# Altium footprint library Watch Max.PcbLib: 66 footprints (part 3 of 5)
Each footprint in its own frame and in the unit in brackets; x right, y up, seen from the top. Pads: shape width x height; smd on the part's side, far side on the other; paste and mask are expansions set on the pad; w line width, h text height; cw(c..) or ccw(c..) is an arc to the next point about the centre after c.
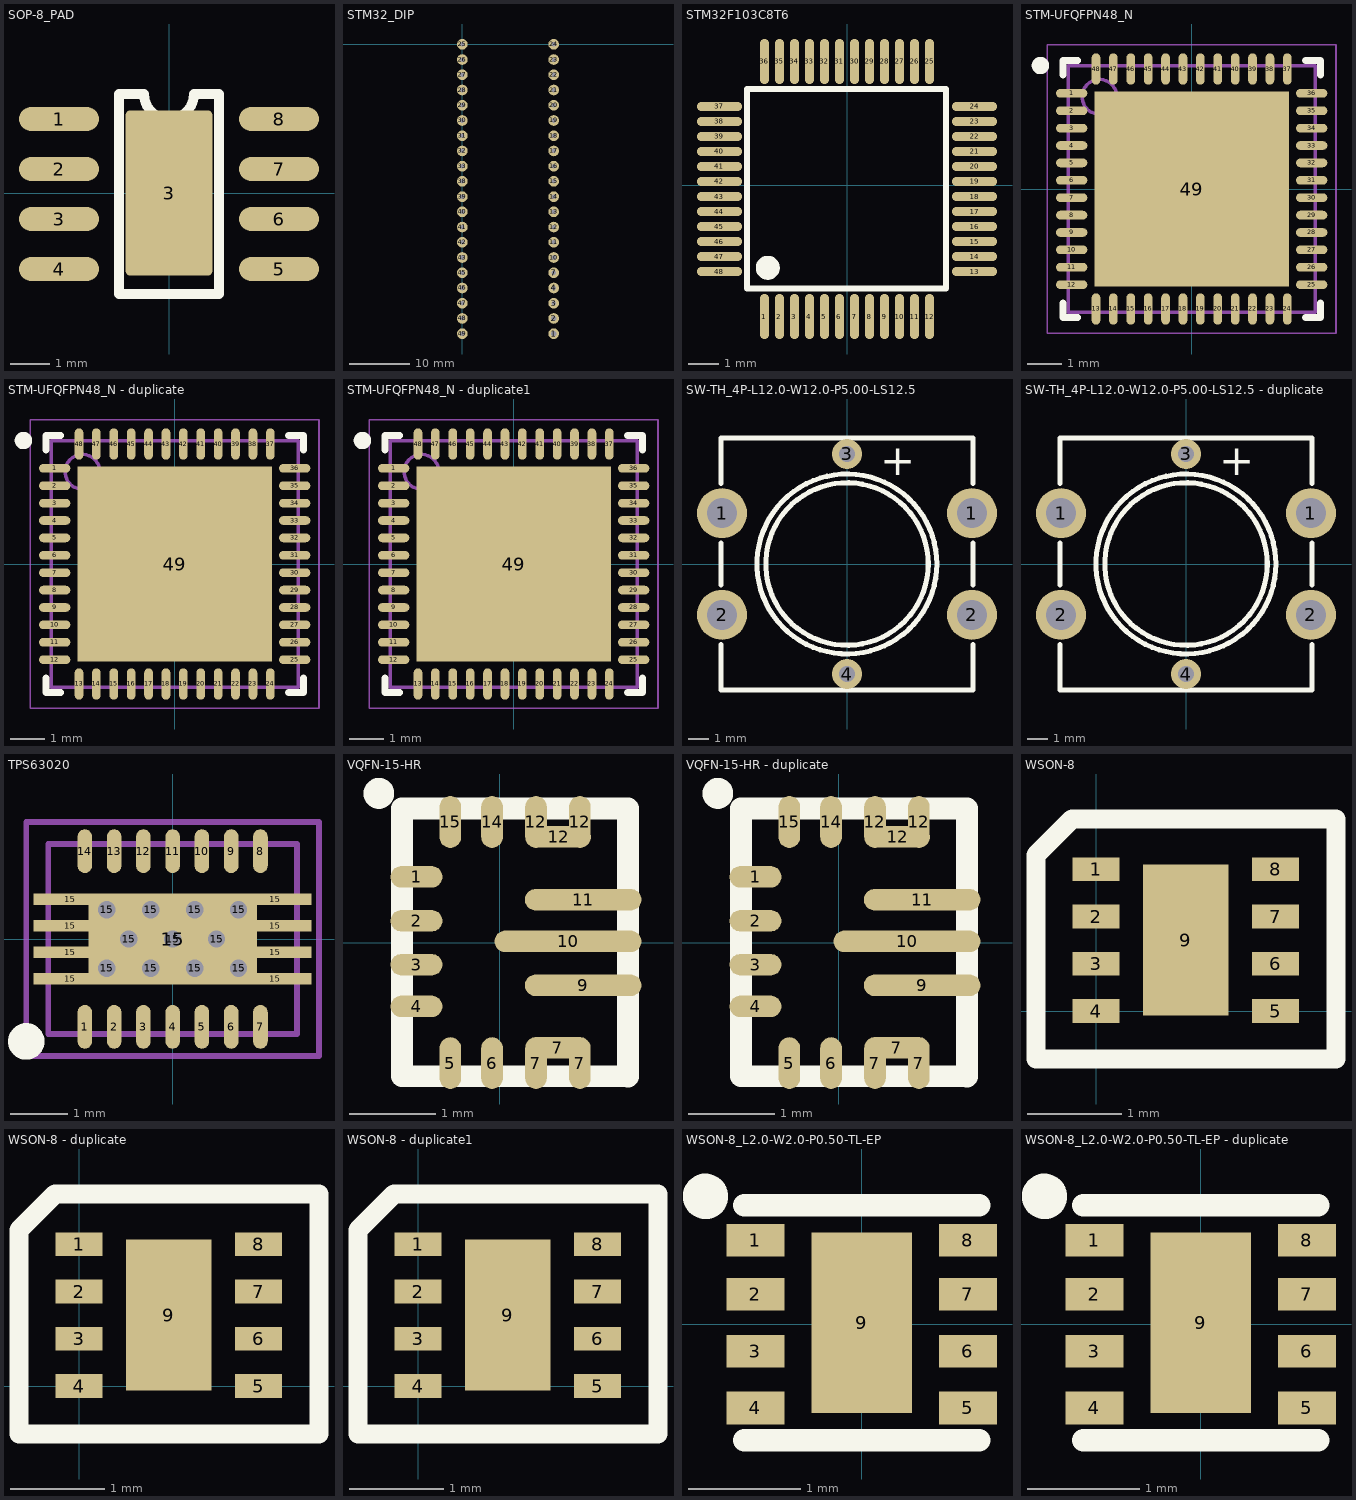
[diagram p2: the footprints below, top view; thin cyan lines are the x and y axes]

## SOP-8_PAD [mil]
pads (9):
  oval 80x24 smd: 1(-110,74) 2(-110,24) 3(-110,-26) 4(-110,-76) 5(110,-76) 6(110,-26) 7(110,24) 8(110,74)
  rrect10% 86.61x165.35 smd: 3(0,0)
Top Overlay:
  lines w10: -50,-101 50,-101 50,99 25,99 cw(c0,99) -25,99 -50,99 -50,-101
3D body "SOP8.STEP": height 62.99, standoff 0, extent -117.7,-98.62 120.17,99.02

## STM32_DIP [mil]
pads (40):
  round 70 hole 35: 1(600,-1900) 2(600,-1800)
  round 70 hole 30: 3(600,-1700) 4(600,-1600) 7(600,-1500) 10(600,-1400) 11(600,-1300) 12(600,-1200) 13(600,-1100) 14(600,-1000) 15(600,-900) 16(600,-800) 17(600,-700) 18(600,-600) 19(600,-500) 20(600,-400) 21(600,-300) 22(600,-200) 23(600,-100) 24(600,0) 25(0,0) 26(0,-100) 27(0,-200) 28(0,-300) 29(0,-400) 30(0,-500) 31(0,-600) 32(0,-700) 33(0,-800) 38(0,-900) 39(0,-1000) 40(0,-1100) 41(0,-1200) 42(0,-1300) 43(0,-1400) 45(0,-1500) 46(0,-1600) 47(0,-1700) 48(0,-1800) 49(0,-1900)
3D body "YAAJ_BluePill.STEP": height 450.42, standoff -165.13, extent -156.72,-1994.28 733.04,92.34

## STM32F103C8T6 [mm]
pads (48):
  oval 0.3x1.5 smd: 1(-2.75,-4.377) 2(-2.25,-4.377) 3(-1.75,-4.377) 4(-1.25,-4.377) 5(-0.75,-4.377) 6(-0.25,-4.377) 7(0.25,-4.377) 8(0.75,-4.377) 9(1.25,-4.377) 10(1.75,-4.377) 11(2.25,-4.377) 12(2.75,-4.377) 25(2.75,4.123) 26(2.25,4.123) 27(1.75,4.123) 28(1.25,4.123) 29(0.75,4.123) 30(0.25,4.123) 31(-0.25,4.123) 32(-0.75,4.123) 33(-1.25,4.123) 34(-1.75,4.123) 35(-2.25,4.123) 36(-2.75,4.123)
  oval 1.5x0.3 smd: 13(4.25,-2.877) 14(4.25,-2.377) 15(4.25,-1.877) 16(4.25,-1.377) 17(4.25,-0.877) 18(4.25,-0.377) 19(4.25,0.123) 20(4.25,0.623) 21(4.25,1.123) 22(4.25,1.623) 23(4.25,2.123) 24(4.25,2.623) 37(-4.25,2.623) 38(-4.25,2.123) 39(-4.25,1.623) 40(-4.25,1.123) 41(-4.25,0.623) 42(-4.25,0.123) 43(-4.25,-0.377) 44(-4.25,-0.877) 45(-4.25,-1.377) 46(-4.25,-1.877) 47(-4.25,-2.377) 48(-4.25,-2.877)
Top Overlay:
  lines w0.2: -2.896,3.213 3.302,3.213 3.302,-3.442 -3.327,-3.442 -3.327,3.213 -2.565,3.213
  lines w0.4: -2.642,-2.553 ccw(c-2.64,-2.753) -2.639,-2.553
3D body "STM32 LQFP48.step": height 1.5, standoff 0, extent -4.496,-4.687 4.521,4.331

## STM-UFQFPN48_N [mm] "QFN, 48-Leads, Body 7.1x7.1mm, Pitch 0.5mm, Thermal Pad 5.6x5.6mm, IPC Medium Density"
height 0.6
pads (49):
  oval 0.9x0.25 smd: 1(-3.45,2.75) 2(-3.45,2.25) 3(-3.45,1.75) 4(-3.45,1.25) 5(-3.45,0.75) 6(-3.45,0.25) 7(-3.45,-0.25) 8(-3.45,-0.75) 9(-3.45,-1.25) 10(-3.45,-1.75) 11(-3.45,-2.25) 12(-3.45,-2.75) 25(3.45,-2.75) 26(3.45,-2.25) 27(3.45,-1.75) 28(3.45,-1.25) 29(3.45,-0.75) 30(3.45,-0.25) 31(3.45,0.25) 32(3.45,0.75) 33(3.45,1.25) 34(3.45,1.75) 35(3.45,2.25) 36(3.45,2.75)
  oval 0.25x0.9 smd: 13(-2.75,-3.45) 14(-2.25,-3.45) 15(-1.75,-3.45) 16(-1.25,-3.45) 17(-0.75,-3.45) 18(-0.25,-3.45) 19(0.25,-3.45) 20(0.75,-3.45) 21(1.25,-3.45) 22(1.75,-3.45) 23(2.25,-3.45) 24(2.75,-3.45) 37(2.75,3.45) 38(2.25,3.45) 39(1.75,3.45) 40(1.25,3.45) 41(0.75,3.45) 42(0.25,3.45) 43(-0.25,3.45) 44(-0.75,3.45) 45(-1.25,3.45) 46(-1.75,3.45) 47(-2.25,3.45) 48(-2.75,3.45)
  rect 5.6x5.6 smd: 49(0,0)
Top Overlay:
  circle w0.25: c-4.35,3.55 r0.125
  lines w0.2: -3.7,-3.275 -3.7,-3.7 -3.275,-3.7 ; -3.7,3.275 -3.7,3.7 -3.275,3.7 ; 3.275,-3.7 3.7,-3.7 3.7,-3.275 ; 3.275,3.7 3.7,3.7 3.7,3.275
Mechanical 13:
  circle w0.1: c-2.65,2.65 r0.5
  lines w0.1: -3.55,-3.55 -3.55,3.55 3.55,3.55 3.55,-3.55 -3.55,-3.55
Mechanical 15:
  lines w0.05: -4.15,-4.15 -4.15,4.15 4.15,4.15 4.15,-4.15 -4.15,-4.15
  lines w0.1: -0.5,0 0.5,0 ; 0,-0.5 0,0.5
3D body: height 0.6, standoff 0, extent -3.55,-3.55 3.55,3.55

## STM-UFQFPN48_N - duplicate [mm] "QFN, 48-Leads, Body 7.1x7.1mm, Pitch 0.5mm, Thermal Pad 5.6x5.6mm, IPC Medium Density"
height 0.6
pads (49):
  oval 0.9x0.25 smd: 1(-3.45,2.75) 2(-3.45,2.25) 3(-3.45,1.75) 4(-3.45,1.25) 5(-3.45,0.75) 6(-3.45,0.25) 7(-3.45,-0.25) 8(-3.45,-0.75) 9(-3.45,-1.25) 10(-3.45,-1.75) 11(-3.45,-2.25) 12(-3.45,-2.75) 25(3.45,-2.75) 26(3.45,-2.25) 27(3.45,-1.75) 28(3.45,-1.25) 29(3.45,-0.75) 30(3.45,-0.25) 31(3.45,0.25) 32(3.45,0.75) 33(3.45,1.25) 34(3.45,1.75) 35(3.45,2.25) 36(3.45,2.75)
  oval 0.25x0.9 smd: 13(-2.75,-3.45) 14(-2.25,-3.45) 15(-1.75,-3.45) 16(-1.25,-3.45) 17(-0.75,-3.45) 18(-0.25,-3.45) 19(0.25,-3.45) 20(0.75,-3.45) 21(1.25,-3.45) 22(1.75,-3.45) 23(2.25,-3.45) 24(2.75,-3.45) 37(2.75,3.45) 38(2.25,3.45) 39(1.75,3.45) 40(1.25,3.45) 41(0.75,3.45) 42(0.25,3.45) 43(-0.25,3.45) 44(-0.75,3.45) 45(-1.25,3.45) 46(-1.75,3.45) 47(-2.25,3.45) 48(-2.75,3.45)
  rect 5.6x5.6 smd: 49(0,0)
Top Overlay:
  circle w0.25: c-4.35,3.55 r0.125
  lines w0.2: -3.7,-3.275 -3.7,-3.7 -3.275,-3.7 ; -3.7,3.275 -3.7,3.7 -3.275,3.7 ; 3.275,-3.7 3.7,-3.7 3.7,-3.275 ; 3.275,3.7 3.7,3.7 3.7,3.275
Mechanical 13:
  circle w0.1: c-2.65,2.65 r0.5
  lines w0.1: -3.55,-3.55 -3.55,3.55 3.55,3.55 3.55,-3.55 -3.55,-3.55
Mechanical 15:
  lines w0.05: -4.15,-4.15 -4.15,4.15 4.15,4.15 4.15,-4.15 -4.15,-4.15
3D body: height 0.6, standoff 0, extent -3.55,-3.55 3.55,3.55

## STM-UFQFPN48_N - duplicate1 [mm] "QFN, 48-Leads, Body 7.1x7.1mm, Pitch 0.5mm, Thermal Pad 5.6x5.6mm, IPC Medium Density"
height 0.6
pads (49):
  oval 0.9x0.25 smd: 1(-3.45,2.75) 2(-3.45,2.25) 3(-3.45,1.75) 4(-3.45,1.25) 5(-3.45,0.75) 6(-3.45,0.25) 7(-3.45,-0.25) 8(-3.45,-0.75) 9(-3.45,-1.25) 10(-3.45,-1.75) 11(-3.45,-2.25) 12(-3.45,-2.75) 25(3.45,-2.75) 26(3.45,-2.25) 27(3.45,-1.75) 28(3.45,-1.25) 29(3.45,-0.75) 30(3.45,-0.25) 31(3.45,0.25) 32(3.45,0.75) 33(3.45,1.25) 34(3.45,1.75) 35(3.45,2.25) 36(3.45,2.75)
  oval 0.25x0.9 smd: 13(-2.75,-3.45) 14(-2.25,-3.45) 15(-1.75,-3.45) 16(-1.25,-3.45) 17(-0.75,-3.45) 18(-0.25,-3.45) 19(0.25,-3.45) 20(0.75,-3.45) 21(1.25,-3.45) 22(1.75,-3.45) 23(2.25,-3.45) 24(2.75,-3.45) 37(2.75,3.45) 38(2.25,3.45) 39(1.75,3.45) 40(1.25,3.45) 41(0.75,3.45) 42(0.25,3.45) 43(-0.25,3.45) 44(-0.75,3.45) 45(-1.25,3.45) 46(-1.75,3.45) 47(-2.25,3.45) 48(-2.75,3.45)
  rect 5.6x5.6 smd: 49(0,0)
Top Overlay:
  circle w0.25: c-4.35,3.55 r0.125
  lines w0.2: -3.7,-3.275 -3.7,-3.7 -3.275,-3.7 ; -3.7,3.275 -3.7,3.7 -3.275,3.7 ; 3.275,-3.7 3.7,-3.7 3.7,-3.275 ; 3.275,3.7 3.7,3.7 3.7,3.275
Mechanical 13:
  circle w0.1: c-2.65,2.65 r0.5
  lines w0.1: -3.55,-3.55 -3.55,3.55 3.55,3.55 3.55,-3.55 -3.55,-3.55
Mechanical 15:
  lines w0.05: -4.15,-4.15 -4.15,4.15 4.15,4.15 4.15,-4.15 -4.15,-4.15
3D body: height 0.6, standoff 0, extent -3.55,-3.55 3.55,3.55

## SW-TH_4P-L12.0-W12.0-P5.00-LS12.5 [mm]
pads (6):
  round 2.5 hole 1.5: 1(-6.25,2.54) 1(6.25,2.54) 2(-6.25,-2.54) 2(6.25,-2.54)
  round 1.5 hole 0.8: 3(0,5.5) 4(0,-5.5)
Top Overlay:
  circle w0.254: c0,0 r4.064
  circle w0.254: c-0.002,0.002 r4.498
  lines w0.254: -6.3,-4.02 -6.3,-6.3 6.3,-6.3 6.3,-4.02 ; -6.3,-1.06 -6.3,1.06 ; -6.3,4.02 -6.3,6.3 6.3,6.3 6.3,4.02 ; 6.3,-1.06 6.3,1.06
  text "+" at 1.651,4.445 h1.52

## SW-TH_4P-L12.0-W12.0-P5.00-LS12.5 - duplicate [mm]
pads (6):
  round 2.5 hole 1.5: 1(-6.25,2.54) 1(6.25,2.54) 2(-6.25,-2.54) 2(6.25,-2.54)
  round 1.5 hole 0.8: 3(0,5.5) 4(0,-5.5)
Top Overlay:
  circle w0.254: c0,0 r4.064
  circle w0.254: c-0.002,0.002 r4.498
  lines w0.254: -6.3,-4.02 -6.3,-6.3 6.3,-6.3 6.3,-4.02 ; -6.3,-1.06 -6.3,1.06 ; -6.3,4.02 -6.3,6.3 6.3,6.3 6.3,4.02 ; 6.3,-1.06 6.3,1.06
  text "+" at 1.651,4.445 h1.52

## TPS63020 [mil] "High Efficiency Single Inductor Buck-Boost Converter With 4-A Switches"
height 44.88
pads (34):
  oval 10x30 smd: 1(-60,-60) 2(-40,-60) 3(-20,-60) 4(0,-60) 5(20,-60) 6(40,-60) 7(60,-60) 8(60,60) 9(40,60) 10(20,60) 11(0,60) 12(-20,60) 13(-40,60) 14(-60,60)
  rect 50x7.87 smd: 15(-70,-27.17) 15(-70,-9.06) 15(-70,9.06) 15(-70,27.17) 15(70,-27.17) 15(70,-9.06) 15(70,9.06) 15(70,27.17)
  round 11.81 hole 11.81: 15(-45,-20) 15(-45,20) 15(-30,0) 15(-15,-20) 15(-15,20) 15(0,0) 15(15,-20) 15(15,20) 15(30,0) 15(45,-20) 15(45,20)
  rect 115x62.2 smd: 15(0,0)
Top Overlay:
  circle w15: c-100,-70 r5
Mechanical 13:
  lines w3.94: -85,-65 -85,65 85,65 85,-65 -85,-65
Mechanical 15:
  lines w3.94: -100,-80 100,-80 100,80 -100,80 -100,-80
3D body: height 30, standoff 0, extent -85,-65 85,65

## VQFN-15-HR [mm] "VQFN"
pads (17):
  oval 0.599x0.25 smd: 1(-0.964,0.759) 2(-0.964,0.251) 3(-0.964,-0.257) 4(-0.964,-0.739)
  oval 0.25x0.599 smd: 5(-0.573,-1.394) 6(-0.09,-1.394) 7(0.418,-1.394) 7(0.926,-1.394) 12(0.418,1.394) 12(0.926,1.394) 14(-0.09,1.394) 15(-0.573,1.394)
  oval 0.75x0.25 smd: 7(0.672,-1.217) 12(0.679,1.222)
  oval 1.349x0.25 smd: 9(0.964,-0.495) 11(0.964,0.495)
  oval 1.7x0.25 smd: 10(0.789,0.013)
Top Overlay:
  circle w0.254: c-1.399,1.725 r0.051
  lines w0.254: -1.132,1.553 -1.132,-1.547 1.468,-1.547 ; -1.115,1.552 1.485,1.552 1.485,-1.548

## VQFN-15-HR - duplicate [mm] "VQFN"
pads (17):
  oval 0.599x0.25 smd: 1(-0.964,0.759) 2(-0.964,0.251) 3(-0.964,-0.257) 4(-0.964,-0.739)
  oval 0.25x0.599 smd: 5(-0.573,-1.394) 6(-0.09,-1.394) 7(0.418,-1.394) 7(0.926,-1.394) 12(0.418,1.394) 12(0.926,1.394) 14(-0.09,1.394) 15(-0.573,1.394)
  oval 0.75x0.25 smd: 7(0.672,-1.217) 12(0.679,1.222)
  oval 1.349x0.25 smd: 9(0.964,-0.495) 11(0.964,0.495)
  oval 1.7x0.25 smd: 10(0.789,0.013)
Top Overlay:
  circle w0.254: c-1.399,1.725 r0.051
  lines w0.254: -1.132,1.553 -1.132,-1.547 1.468,-1.547 ; -1.115,1.552 1.485,1.552 1.485,-1.548

## WSON-8 [mm]
pads (9):
  rect 0.5x0.25 smd: 1(0,1.5) 2(0,1) 3(0,0.5) 4(0,0) 5(1.9,0) 6(1.9,0.5) 7(1.9,1) 8(1.9,1.5)
  rect 0.9x1.6 smd mask+0.102: 9(0.95,0.75)
Top Overlay:
  lines w0.2: -0.635,-0.508 2.54,-0.508 2.54,2.032 -0.254,2.032 -0.635,1.651 -0.635,-0.508

## WSON-8 - duplicate [mm]
pads (9):
  rect 0.5x0.25 smd: 1(0,1.5) 2(0,1) 3(0,0.5) 4(0,0) 5(1.9,0) 6(1.9,0.5) 7(1.9,1) 8(1.9,1.5)
  rect 0.9x1.6 smd mask+0.102: 9(0.95,0.75)
Top Overlay:
  lines w0.2: -0.635,-0.508 2.54,-0.508 2.54,2.032 -0.254,2.032 -0.635,1.651 -0.635,-0.508

## WSON-8 - duplicate1 [mm]
pads (9):
  rect 0.5x0.25 smd: 1(0,1.5) 2(0,1) 3(0,0.5) 4(0,0) 5(1.9,0) 6(1.9,0.5) 7(1.9,1) 8(1.9,1.5)
  rect 0.9x1.6 smd mask+0.102: 9(0.95,0.75)
Top Overlay:
  lines w0.2: -0.635,-0.508 -0.635,1.651 -0.254,2.032 2.54,2.032 2.54,-0.508 -0.635,-0.508

## WSON-8_L2.0-W2.0-P0.50-TL-EP [mil]
pads (9):
  rect 20.5x11.5 smd: 1(-37.4,29.5) 2(-37.4,10.5) 3(-37.4,-9.5) 4(-37.4,-29.5) 5(37.4,-29.5) 6(37.4,-9.5) 7(37.4,10.5) 8(37.4,29.5)
  rect 35.5x63.5 smd: 9(0,0.5)
Top Overlay:
  circle w10: c-55,45 r3
  lines w7.9: -41.34,41.84 41.34,41.84 ; -41.3,-40.84 41.34,-40.84

## WSON-8_L2.0-W2.0-P0.50-TL-EP - duplicate [mil]
pads (9):
  rect 20.5x11.5 smd: 1(-37.4,29.5) 2(-37.4,10.5) 3(-37.4,-9.5) 4(-37.4,-29.5) 5(37.4,-29.5) 6(37.4,-9.5) 7(37.4,10.5) 8(37.4,29.5)
  rect 35.5x63.5 smd: 9(0,0.5)
Top Overlay:
  circle w10: c-55,45 r3
  lines w7.9: -41.34,41.84 41.34,41.84 ; -41.3,-40.84 41.34,-40.84